# Altium integrated library ALTIUM-PHD_2_54_SMT_SOCKET_HEADER_6100XXXXX21-rev16c.IntLib: 215 symbols (continued)
## 610026243021
designator J?, comment 26p  (value not drawn)
WR-PHD 2.54 mm SMT Dual Socket Header Bottom Entry, 26p; PartNumber: 610026243021; PublishedDate: July 2016; Publisher: Wurth Elektronik; ComponentLink1Description: Manufacturer; ComponentLink1URL: http://www.we-online.de; ComponentLink2Description: Datasheet; ComponentLink2URL: http://katalog.we-online.de/em/datasheet/6100xx243021.pdf; PinNumber: 26p
footprint 610026243021
pins: 1, 2, 3, 4, 5, 6, 7, 8, 9, 10, 11, 12, 13, 14, 15, 16, 17, 18, 19, 20, 21, 22, 23, 24, 25, 26

## 610028243021
designator J?, comment 28p  (value not drawn)
WR-PHD 2.54 mm SMT Dual Socket Header Bottom Entry, 28p; PartNumber: 610028243021; PublishedDate: July 2016; Publisher: Wurth Elektronik; ComponentLink1Description: Manufacturer; ComponentLink1URL: http://www.we-online.de; ComponentLink2Description: Datasheet; ComponentLink2URL: http://katalog.we-online.de/em/datasheet/6100xx243021.pdf; PinNumber: 28p
footprint 610028243021
pins: 1, 2, 3, 4, 5, 6, 7, 8, 9, 10, 11, 12, 13, 14, 15, 16, 17, 18, 19, 20, 21, 22, 23, 24, 25, 26, 27, 28

## 610030243021
designator J?, comment 30p  (value not drawn)
WR-PHD 2.54 mm SMT Dual Socket Header Bottom Entry, 30p; PartNumber: 610030243021; PublishedDate: July 2016; Publisher: Wurth Elektronik; ComponentLink1Description: Manufacturer; ComponentLink1URL: http://www.we-online.de; ComponentLink2Description: Datasheet; ComponentLink2URL: http://katalog.we-online.de/em/datasheet/6100xx243021.pdf; PinNumber: 30p
footprint 610030243021
pins: 1, 2, 3, 4, 5, 6, 7, 8, 9, 10, 11, 12, 13, 14, 15, 16, 17, 18, 19, 20, 21, 22, 23, 24, 25, 26, 27, 28, 29, 30

## 610032243021
designator J?, comment 32p  (value not drawn)
WR-PHD 2.54 mm SMT Dual Socket Header Bottom Entry, 32p; PartNumber: 610032243021; PublishedDate: July 2016; Publisher: Wurth Elektronik; ComponentLink1Description: Manufacturer; ComponentLink1URL: http://www.we-online.de; ComponentLink2Description: Datasheet; ComponentLink2URL: http://katalog.we-online.de/em/datasheet/6100xx243021.pdf; PinNumber: 32p
footprint 610032243021
pins: 1, 2, 3, 4, 5, 6, 7, 8, 9, 10, 11, 12, 13, 14, 15, 16, 17, 18, 19, 20, 21, 22, 23, 24, 25, 26, 27, 28, 29, 30, 31, 32

## 610034243021
designator J?, comment 34p  (value not drawn)
WR-PHD 2.54 mm SMT Dual Socket Header Bottom Entry, 34p; PartNumber: 610034243021; PublishedDate: July 2016; Publisher: Wurth Elektronik; ComponentLink1Description: Manufacturer; ComponentLink1URL: http://www.we-online.de; ComponentLink2Description: Datasheet; ComponentLink2URL: http://katalog.we-online.de/em/datasheet/6100xx243021.pdf; PinNumber: 34p
footprint 610034243021
pins: 1, 2, 3, 4, 5, 6, 7, 8, 9, 10, 11, 12, 13, 14, 15, 16, 17, 18, 19, 20, 21, 22, 23, 24, 25, 26, 27, 28, 29, 30, 31, 32, 33, 34

## 610036243021
designator J?, comment 36p  (value not drawn)
WR-PHD 2.54 mm SMT Dual Socket Header Bottom Entry, 36p; PartNumber: 610036243021; PublishedDate: July 2016; Publisher: Wurth Elektronik; ComponentLink1Description: Manufacturer; ComponentLink1URL: http://www.we-online.de; ComponentLink2Description: Datasheet; ComponentLink2URL: http://katalog.we-online.de/em/datasheet/6100xx243021.pdf; PinNumber: 36p
footprint 610036243021
pins: 1, 2, 3, 4, 5, 6, 7, 8, 9, 10, 11, 12, 13, 14, 15, 16, 17, 18, 19, 20, 21, 22, 23, 24, 25, 26, 27, 28, 29, 30, 31, 32, 33, 34, 35, 36


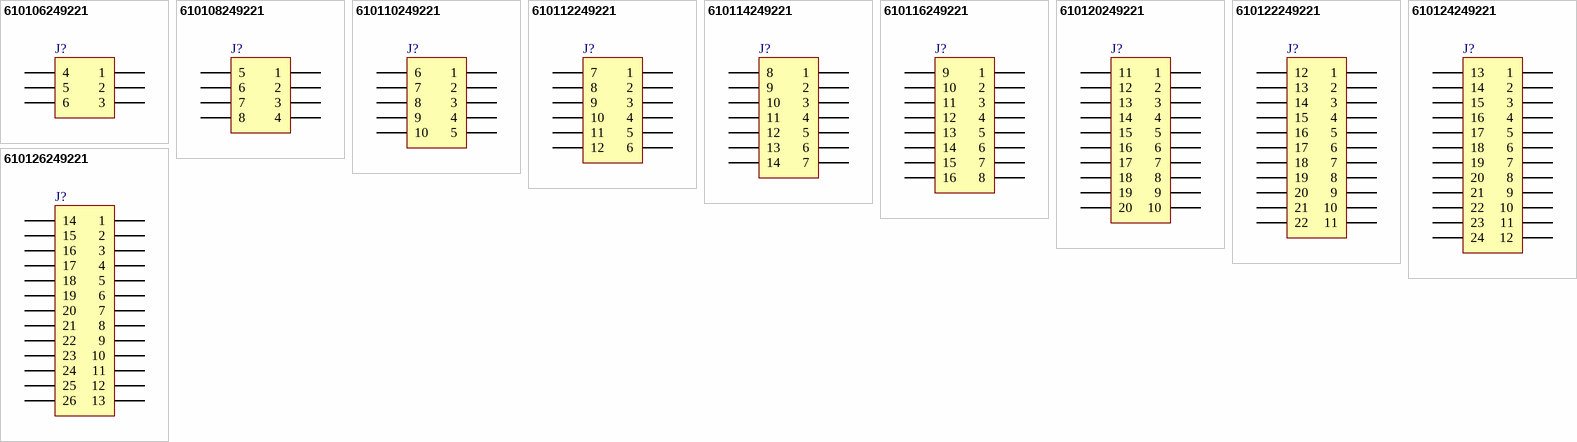
[diagram p4: symbols 610106249221 to 610126249221]

## 610106249221
designator J?, comment 06p  (value not drawn)
WR-PHD 2.54 mm PCB Socket Header-SMT Type-Double Row-Right Angle, 06p; PartNumber: 610106249221; PublishedDate: July 2016; Publisher: Wurth Elektronik; ComponentLink1Description: Manufacturer; ComponentLink1URL: http://www.we-online.de; ComponentLink2Description: Datasheet; ComponentLink2URL: http://katalog.we-online.de/em/datasheet/6101xx249221.pdf; PinNumber: 06p
footprint 610106249221
pins: 1, 2, 3, 4, 5, 6

## 610108249221
designator J?, comment 08p  (value not drawn)
WR-PHD 2.54 mm PCB Socket Header-SMT Type-Double Row-Right Angle, 08p; PartNumber: 610108249221; PublishedDate: July 2016; Publisher: Wurth Elektronik; ComponentLink1Description: Manufacturer; ComponentLink1URL: http://www.we-online.de; ComponentLink2Description: Datasheet; ComponentLink2URL: http://katalog.we-online.de/em/datasheet/6101xx249221.pdf; PinNumber: 08p
footprint 610108249221
pins: 1, 2, 3, 4, 5, 6, 7, 8

## 610110249221
designator J?, comment 10p  (value not drawn)
WR-PHD 2.54 mm PCB Socket Header-SMT Type-Double Row-Right Angle, 10p; PartNumber: 610110249221; PublishedDate: July 2016; Publisher: Wurth Elektronik; ComponentLink1Description: Manufacturer; ComponentLink1URL: http://www.we-online.de; ComponentLink2Description: Datasheet; ComponentLink2URL: http://katalog.we-online.de/em/datasheet/6101xx249221.pdf; PinNumber: 10p
footprint 610110249221
pins: 1, 2, 3, 4, 5, 6, 7, 8, 9, 10

## 610112249221
designator J?, comment 12p  (value not drawn)
WR-PHD 2.54 mm PCB Socket Header-SMT Type-Double Row-Right Angle, 12p; PartNumber: 610112249221; PublishedDate: July 2016; Publisher: Wurth Elektronik; ComponentLink1Description: Manufacturer; ComponentLink1URL: http://www.we-online.de; ComponentLink2Description: Datasheet; ComponentLink2URL: http://katalog.we-online.de/em/datasheet/6101xx249221.pdf; PinNumber: 12p
footprint 610112249221
pins: 1, 2, 3, 4, 5, 6, 7, 8, 9, 10, 11, 12

## 610114249221
designator J?, comment 14p  (value not drawn)
WR-PHD 2.54 mm PCB Socket Header-SMT Type-Double Row-Right Angle, 14p; PartNumber: 610114249221; PublishedDate: July 2016; Publisher: Wurth Elektronik; ComponentLink1Description: Manufacturer; ComponentLink1URL: http://www.we-online.de; ComponentLink2Description: Datasheet; ComponentLink2URL: http://katalog.we-online.de/em/datasheet/6101xx249221.pdf; PinNumber: 14p
footprint 610114249221
pins: 1, 2, 3, 4, 5, 6, 7, 8, 9, 10, 11, 12, 13, 14

## 610116249221
designator J?, comment 16p  (value not drawn)
WR-PHD 2.54 mm PCB Socket Header-SMT Type-Double Row-Right Angle, 16p; PartNumber: 610116249221; PublishedDate: July 2016; Publisher: Wurth Elektronik; ComponentLink1Description: Manufacturer; ComponentLink1URL: http://www.we-online.de; ComponentLink2Description: Datasheet; ComponentLink2URL: http://katalog.we-online.de/em/datasheet/6101xx249221.pdf; PinNumber: 16p
footprint 610116249221
pins: 1, 2, 3, 4, 5, 6, 7, 8, 9, 10, 11, 12, 13, 14, 15, 16

## 610120249221
designator J?, comment 20p  (value not drawn)
WR-PHD 2.54 mm PCB Socket Header-SMT Type-Double Row-Right Angle, 20p; PartNumber: 610120249221; PublishedDate: July 2016; Publisher: Wurth Elektronik; ComponentLink1Description: Manufacturer; ComponentLink1URL: http://www.we-online.de; ComponentLink2Description: Datasheet; ComponentLink2URL: http://katalog.we-online.de/em/datasheet/6101xx249221.pdf; PinNumber: 20p
footprint 610120249221
pins: 1, 2, 3, 4, 5, 6, 7, 8, 9, 10, 11, 12, 13, 14, 15, 16, 17, 18, 19, 20

## 610122249221
designator J?, comment 22p  (value not drawn)
WR-PHD 2.54 mm PCB Socket Header-SMT Type-Double Row-Right Angle, 22p; PartNumber: 610122249221; PublishedDate: July 2016; Publisher: Wurth Elektronik; ComponentLink1Description: Manufacturer; ComponentLink1URL: http://www.we-online.de; ComponentLink2Description: Datasheet; ComponentLink2URL: http://katalog.we-online.de/em/datasheet/6101xx249221.pdf; PinNumber: 22p
footprint 610122249221
pins: 1, 2, 3, 4, 5, 6, 7, 8, 9, 10, 11, 12, 13, 14, 15, 16, 17, 18, 19, 20, 21, 22

## 610124249221
designator J?, comment 24p  (value not drawn)
WR-PHD 2.54 mm PCB Socket Header-SMT Type-Double Row-Right Angle, 24p; PartNumber: 610124249221; PublishedDate: July 2016; Publisher: Wurth Elektronik; ComponentLink1Description: Manufacturer; ComponentLink1URL: http://www.we-online.de; ComponentLink2Description: Datasheet; ComponentLink2URL: http://katalog.we-online.de/em/datasheet/6101xx249221.pdf; PinNumber: 24p
footprint 610124249221
pins: 1, 2, 3, 4, 5, 6, 7, 8, 9, 10, 11, 12, 13, 14, 15, 16, 17, 18, 19, 20, 21, 22, 23, 24

## 610126249221
designator J?, comment 26p  (value not drawn)
WR-PHD 2.54 mm PCB Socket Header-SMT Type-Double Row-Right Angle, 26p; PartNumber: 610126249221; PublishedDate: July 2016; Publisher: Wurth Elektronik; ComponentLink1Description: Manufacturer; ComponentLink1URL: http://www.we-online.de; ComponentLink2Description: Datasheet; ComponentLink2URL: http://katalog.we-online.de/em/datasheet/6101xx249221.pdf; PinNumber: 26p
footprint 610126249221
pins: 1, 2, 3, 4, 5, 6, 7, 8, 9, 10, 11, 12, 13, 14, 15, 16, 17, 18, 19, 20, 21, 22, 23, 24, 25, 26


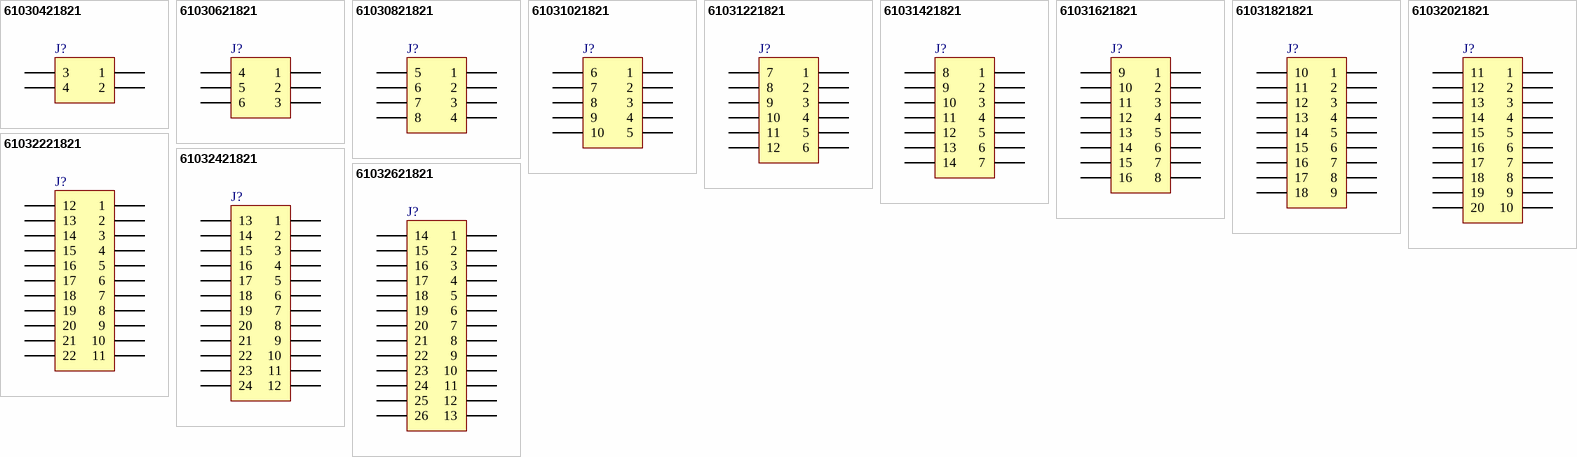
[diagram p5: symbols 61030421821 to 61032621821]

## 61030421821
designator J?, comment 04p  (value not drawn)
WR-PHD 2.54 mm Dual SMT Socket Header (Reel), 04p; PartNumber: 61030421821; PublishedDate: July 2016; Publisher: Wurth Elektronik; ComponentLink1Description: Manufacturer; ComponentLink1URL: http://www.we-online.de; ComponentLink2Description: Datasheet; ComponentLink2URL: http://katalog.we-online.de/em/datasheet/6103xx21821.pdf; PinNumber: 04p
footprint 61030421821
pins: 1, 2, 3, 4

## 61030621821
designator J?, comment 06p  (value not drawn)
WR-PHD 2.54 mm Dual SMT Socket Header (Reel), 06p; PartNumber: 61030621821; PublishedDate: July 2016; Publisher: Wurth Elektronik; ComponentLink1Description: Manufacturer; ComponentLink1URL: http://www.we-online.de; ComponentLink2Description: Datasheet; ComponentLink2URL: http://katalog.we-online.de/em/datasheet/6103xx21821.pdf; PinNumber: 06p
footprint 61030621821
pins: 1, 2, 3, 4, 5, 6

## 61030821821
designator J?, comment 08p  (value not drawn)
WR-PHD 2.54 mm Dual SMT Socket Header (Reel), 08p; PartNumber: 61030821821; PublishedDate: July 2016; Publisher: Wurth Elektronik; ComponentLink1Description: Manufacturer; ComponentLink1URL: http://www.we-online.de; ComponentLink2Description: Datasheet; ComponentLink2URL: http://katalog.we-online.de/em/datasheet/6103xx21821.pdf; PinNumber: 08p
footprint 61030821821
pins: 1, 2, 3, 4, 5, 6, 7, 8

## 61031021821
designator J?, comment 10p  (value not drawn)
WR-PHD 2.54 mm Dual SMT Socket Header (Reel), 10p; PartNumber: 61031021821; PublishedDate: July 2016; Publisher: Wurth Elektronik; ComponentLink1Description: Manufacturer; ComponentLink1URL: http://www.we-online.de; ComponentLink2Description: Datasheet; ComponentLink2URL: http://katalog.we-online.de/em/datasheet/6103xx21821.pdf; PinNumber: 10p
footprint 61031021821
pins: 1, 2, 3, 4, 5, 6, 7, 8, 9, 10

## 61031221821
designator J?, comment 12p  (value not drawn)
WR-PHD 2.54 mm Dual SMT Socket Header (Reel), 12p; PartNumber: 61031221821; PublishedDate: July 2016; Publisher: Wurth Elektronik; ComponentLink1Description: Manufacturer; ComponentLink1URL: http://www.we-online.de; ComponentLink2Description: Datasheet; ComponentLink2URL: http://katalog.we-online.de/em/datasheet/6103xx21821.pdf; PinNumber: 12p
footprint 61031221821
pins: 1, 2, 3, 4, 5, 6, 7, 8, 9, 10, 11, 12

## 61031421821
designator J?, comment 14p  (value not drawn)
WR-PHD 2.54 mm Dual SMT Socket Header (Reel), 14p; PartNumber: 61031421821; PublishedDate: July 2016; Publisher: Wurth Elektronik; ComponentLink1Description: Manufacturer; ComponentLink1URL: http://www.we-online.de; ComponentLink2Description: Datasheet; ComponentLink2URL: http://katalog.we-online.de/em/datasheet/6103xx21821.pdf; PinNumber: 14p
footprint 61031421821
pins: 1, 2, 3, 4, 5, 6, 7, 8, 9, 10, 11, 12, 13, 14

## 61031621821
designator J?, comment 16p  (value not drawn)
WR-PHD 2.54 mm Dual SMT Socket Header (Reel), 16p; PartNumber: 61031621821; PublishedDate: July 2016; Publisher: Wurth Elektronik; ComponentLink1Description: Manufacturer; ComponentLink1URL: http://www.we-online.de; ComponentLink2Description: Datasheet; ComponentLink2URL: http://katalog.we-online.de/em/datasheet/6103xx21821.pdf; PinNumber: 16p
footprint 61031621821
pins: 1, 2, 3, 4, 5, 6, 7, 8, 9, 10, 11, 12, 13, 14, 15, 16

## 61031821821
designator J?, comment 18p  (value not drawn)
WR-PHD 2.54 mm Dual SMT Socket Header (Reel), 18p; PartNumber: 61031821821; PublishedDate: July 2016; Publisher: Wurth Elektronik; ComponentLink1Description: Manufacturer; ComponentLink1URL: http://www.we-online.de; ComponentLink2Description: Datasheet; ComponentLink2URL: http://katalog.we-online.de/em/datasheet/6103xx21821.pdf; PinNumber: 18p
footprint 61031821821
pins: 1, 2, 3, 4, 5, 6, 7, 8, 9, 10, 11, 12, 13, 14, 15, 16, 17, 18

## 61032021821
designator J?, comment 20p  (value not drawn)
WR-PHD 2.54 mm Dual SMT Socket Header (Reel), 20p; PartNumber: 61032021821; PublishedDate: July 2016; Publisher: Wurth Elektronik; ComponentLink1Description: Manufacturer; ComponentLink1URL: http://www.we-online.de; ComponentLink2Description: Datasheet; ComponentLink2URL: http://katalog.we-online.de/em/datasheet/6103xx21821.pdf; PinNumber: 20p
footprint 61032021821
pins: 1, 2, 3, 4, 5, 6, 7, 8, 9, 10, 11, 12, 13, 14, 15, 16, 17, 18, 19, 20

## 61032221821
designator J?, comment 22p  (value not drawn)
WR-PHD 2.54 mm Dual SMT Socket Header (Reel), 22p; PartNumber: 61032221821; PublishedDate: July 2016; Publisher: Wurth Elektronik; ComponentLink1Description: Manufacturer; ComponentLink1URL: http://www.we-online.de; ComponentLink2Description: Datasheet; ComponentLink2URL: http://katalog.we-online.de/em/datasheet/6103xx21821.pdf; PinNumber: 22p
footprint 61032221821
pins: 1, 2, 3, 4, 5, 6, 7, 8, 9, 10, 11, 12, 13, 14, 15, 16, 17, 18, 19, 20, 21, 22

## 61032421821
designator J?, comment 24p  (value not drawn)
WR-PHD 2.54 mm Dual SMT Socket Header (Reel), 24p; PartNumber: 61032421821; PublishedDate: July 2016; Publisher: Wurth Elektronik; ComponentLink1Description: Manufacturer; ComponentLink1URL: http://www.we-online.de; ComponentLink2Description: Datasheet; ComponentLink2URL: http://katalog.we-online.de/em/datasheet/6103xx21821.pdf; PinNumber: 24p
footprint 61032421821
pins: 1, 2, 3, 4, 5, 6, 7, 8, 9, 10, 11, 12, 13, 14, 15, 16, 17, 18, 19, 20, 21, 22, 23, 24

## 61032621821
designator J?, comment 26p  (value not drawn)
WR-PHD 2.54 mm Dual SMT Socket Header (Reel), 26p; PartNumber: 61032621821; PublishedDate: July 2016; Publisher: Wurth Elektronik; ComponentLink1Description: Manufacturer; ComponentLink1URL: http://www.we-online.de; ComponentLink2Description: Datasheet; ComponentLink2URL: http://katalog.we-online.de/em/datasheet/6103xx21821.pdf; PinNumber: 26p
footprint 61032621821
pins: 1, 2, 3, 4, 5, 6, 7, 8, 9, 10, 11, 12, 13, 14, 15, 16, 17, 18, 19, 20, 21, 22, 23, 24, 25, 26


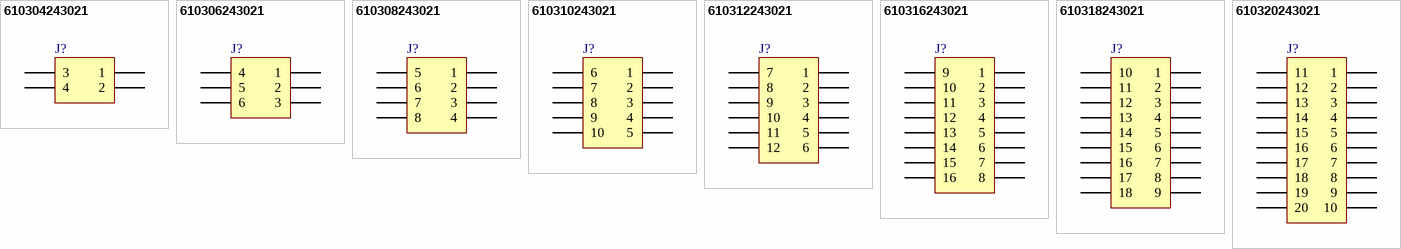
[diagram p6: symbols 610304243021 to 610320243021]

## 610304243021
designator J?, comment 04p  (value not drawn)
WR-PHD 2.54 mm SMT Dual Socket Header Bottom Entry, 04p; PartNumber: 610304243021; PublishedDate: July 2016; Publisher: Wurth Elektronik; ComponentLink1Description: Manufacturer; ComponentLink1URL: http://www.we-online.de; ComponentLink2Description: Datasheet; ComponentLink2URL: http://katalog.we-online.de/em/datasheet/6103xx243021.pdf; PinNumber: 04p
footprint 610304243021
pins: 1, 2, 3, 4

## 610306243021
designator J?, comment 06p  (value not drawn)
WR-PHD 2.54 mm SMT Dual Socket Header Bottom Entry, 06p; PartNumber: 610306243021; PublishedDate: July 2016; Publisher: Wurth Elektronik; ComponentLink1Description: Manufacturer; ComponentLink1URL: http://www.we-online.de; ComponentLink2Description: Datasheet; ComponentLink2URL: http://katalog.we-online.de/em/datasheet/6103xx243021.pdf; PinNumber: 06p
footprint 610306243021
pins: 1, 2, 3, 4, 5, 6

## 610308243021
designator J?, comment 08p  (value not drawn)
WR-PHD 2.54 mm SMT Dual Socket Header Bottom Entry, 08p; PartNumber: 610308243021; PublishedDate: July 2016; Publisher: Wurth Elektronik; ComponentLink1Description: Manufacturer; ComponentLink1URL: http://www.we-online.de; ComponentLink2Description: Datasheet; ComponentLink2URL: http://katalog.we-online.de/em/datasheet/6103xx243021.pdf; PinNumber: 08p
footprint 610308243021
pins: 1, 2, 3, 4, 5, 6, 7, 8

## 610310243021
designator J?, comment 10p  (value not drawn)
WR-PHD 2.54 mm SMT Dual Socket Header Bottom Entry, 10p; PartNumber: 610310243021; PublishedDate: July 2016; Publisher: Wurth Elektronik; ComponentLink1Description: Manufacturer; ComponentLink1URL: http://www.we-online.de; ComponentLink2Description: Datasheet; ComponentLink2URL: http://katalog.we-online.de/em/datasheet/6103xx243021.pdf; PinNumber: 10p
footprint 610310243021
pins: 1, 2, 3, 4, 5, 6, 7, 8, 9, 10

## 610312243021
designator J?, comment 12p  (value not drawn)
WR-PHD 2.54 mm SMT Dual Socket Header Bottom Entry, 12p; PartNumber: 610312243021; PublishedDate: July 2016; Publisher: Wurth Elektronik; ComponentLink1Description: Manufacturer; ComponentLink1URL: http://www.we-online.de; ComponentLink2Description: Datasheet; ComponentLink2URL: http://katalog.we-online.de/em/datasheet/6103xx243021.pdf; PinNumber: 12p
footprint 610312243021
pins: 1, 2, 3, 4, 5, 6, 7, 8, 9, 10, 11, 12

## 610316243021
designator J?, comment 16p  (value not drawn)
WR-PHD 2.54 mm SMT Dual Socket Header Bottom Entry, 16p; PartNumber: 610316243021; PublishedDate: July 2016; Publisher: Wurth Elektronik; ComponentLink1Description: Manufacturer; ComponentLink1URL: http://www.we-online.de; ComponentLink2Description: Datasheet; ComponentLink2URL: http://katalog.we-online.de/em/datasheet/6103xx243021.pdf; PinNumber: 16p
footprint 610316243021
pins: 1, 2, 3, 4, 5, 6, 7, 8, 9, 10, 11, 12, 13, 14, 15, 16

## 610318243021
designator J?, comment 18p  (value not drawn)
WR-PHD 2.54 mm SMT Dual Socket Header Bottom Entry, 18p; PartNumber: 610318243021; PublishedDate: July 2016; Publisher: Wurth Elektronik; ComponentLink1Description: Manufacturer; ComponentLink1URL: http://www.we-online.de; ComponentLink2Description: Datasheet; ComponentLink2URL: http://katalog.we-online.de/em/datasheet/6103xx243021.pdf; PinNumber: 18p
footprint 610318243021
pins: 1, 2, 3, 4, 5, 6, 7, 8, 9, 10, 11, 12, 13, 14, 15, 16, 17, 18

## 610320243021
designator J?, comment 20p  (value not drawn)
WR-PHD 2.54 mm SMT Dual Socket Header Bottom Entry, 20p; PartNumber: 610320243021; PublishedDate: July 2016; Publisher: Wurth Elektronik; ComponentLink1Description: Manufacturer; ComponentLink1URL: http://www.we-online.de; ComponentLink2Description: Datasheet; ComponentLink2URL: http://katalog.we-online.de/em/datasheet/6103xx243021.pdf; PinNumber: 20p
footprint 610320243021
pins: 1, 2, 3, 4, 5, 6, 7, 8, 9, 10, 11, 12, 13, 14, 15, 16, 17, 18, 19, 20


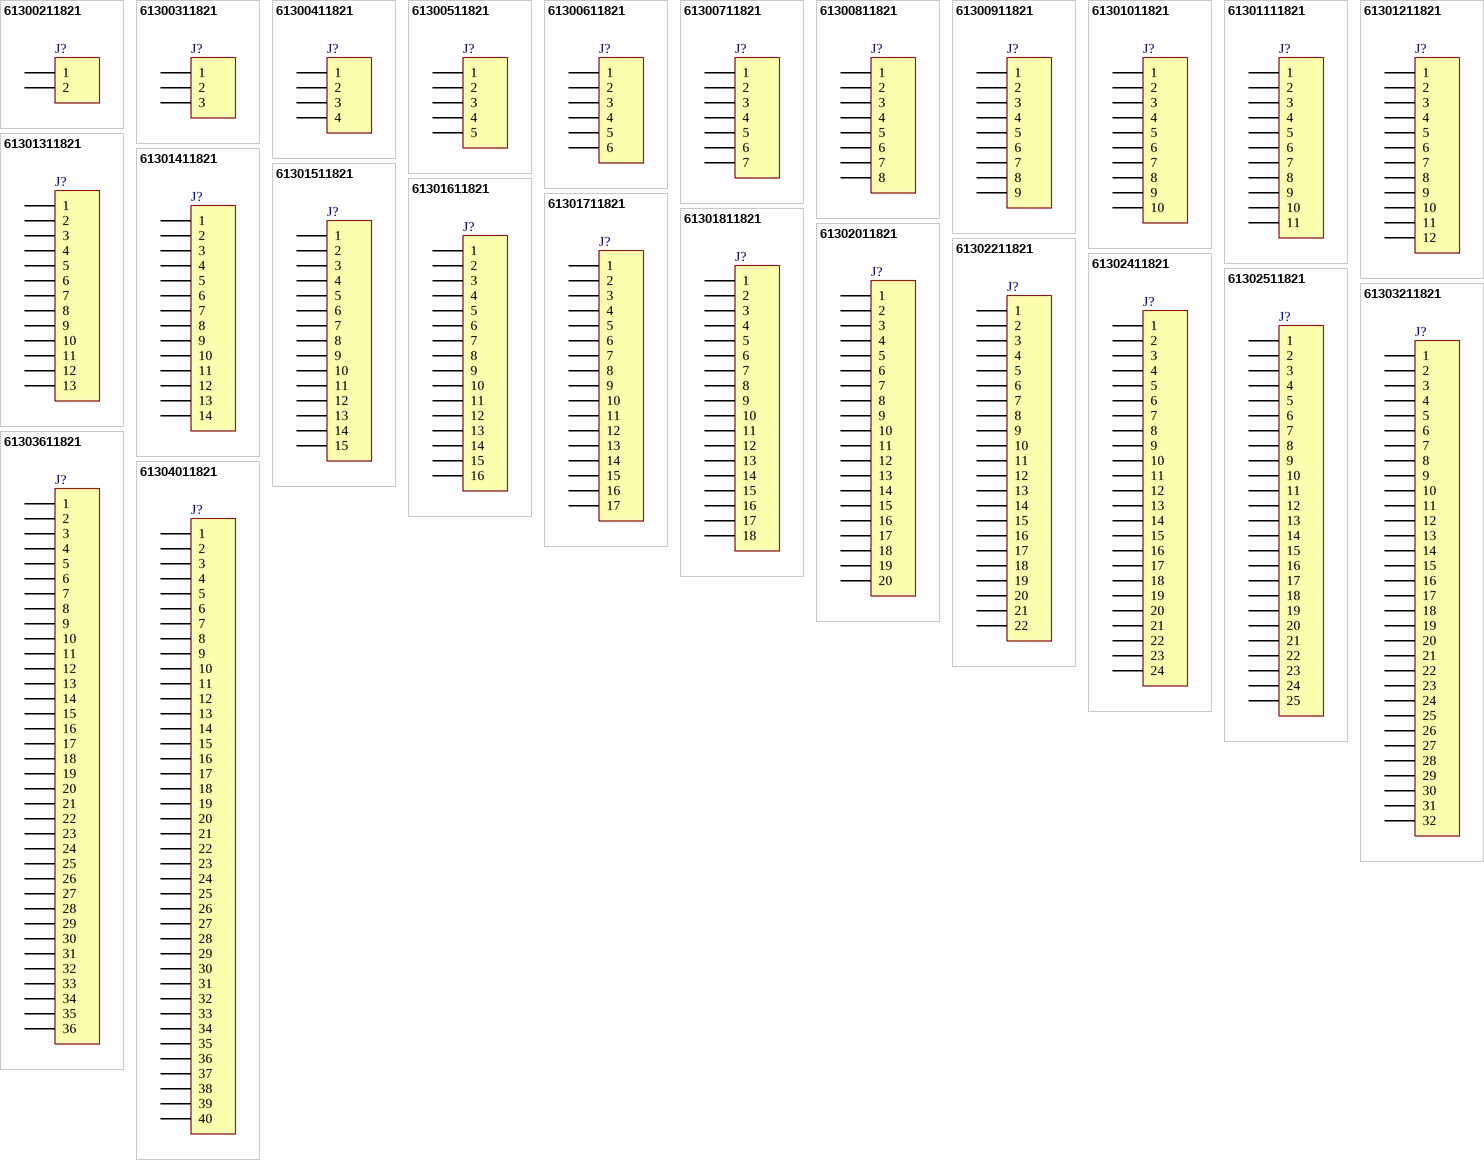
[diagram p7: symbols 61300211821 to 61304011821]

## 61300211821
designator J?, comment 02p  (value not drawn)
WR-PHD 2.54 mm Socket Header, 02p; PartNumber: 61300211821; PublishedDate: July 2016; Publisher: Wurth Elektronik; ComponentLink1Description: Manufacturer; ComponentLink1URL: http://www.we-online.de; ComponentLink2Description: Datasheet; ComponentLink2URL: http://katalog.we-online.de/em/datasheet/6130xx11821.pdf; PinNumber: 02p
footprint 61300211821
pins: 1, 2

## 61300311821
designator J?, comment 03p  (value not drawn)
WR-PHD 2.54 mm Socket Header, 03p; PartNumber: 61300311821; PublishedDate: July 2016; Publisher: Wurth Elektronik; ComponentLink1Description: Manufacturer; ComponentLink1URL: http://www.we-online.de; ComponentLink2Description: Datasheet; ComponentLink2URL: http://katalog.we-online.de/em/datasheet/6130xx11821.pdf; PinNumber: 03p
footprint 61300311821
pins: 1, 2, 3

## 61300411821
designator J?, comment 04p  (value not drawn)
WR-PHD 2.54 mm Socket Header, 04p; PartNumber: 61300411821; PublishedDate: July 2016; Publisher: Wurth Elektronik; ComponentLink1Description: Manufacturer; ComponentLink1URL: http://www.we-online.de; ComponentLink2Description: Datasheet; ComponentLink2URL: http://katalog.we-online.de/em/datasheet/6130xx11821.pdf; PinNumber: 04p
footprint 61300411821
pins: 1, 2, 3, 4

## 61300511821
designator J?, comment 05p  (value not drawn)
WR-PHD 2.54 mm Socket Header, 05p; PartNumber: 61300511821; PublishedDate: July 2016; Publisher: Wurth Elektronik; ComponentLink1Description: Manufacturer; ComponentLink1URL: http://www.we-online.de; ComponentLink2Description: Datasheet; ComponentLink2URL: http://katalog.we-online.de/em/datasheet/6130xx11821.pdf; PinNumber: 05p
footprint 61300511821
pins: 1, 2, 3, 4, 5

## 61300611821
designator J?, comment 06p  (value not drawn)
WR-PHD 2.54 mm Socket Header, 06p; PartNumber: 61300611821; PublishedDate: July 2016; Publisher: Wurth Elektronik; ComponentLink1Description: Manufacturer; ComponentLink1URL: http://www.we-online.de; ComponentLink2Description: Datasheet; ComponentLink2URL: http://katalog.we-online.de/em/datasheet/6130xx11821.pdf; PinNumber: 06p
footprint 61300611821
pins: 1, 2, 3, 4, 5, 6

## 61300711821
designator J?, comment 07p  (value not drawn)
WR-PHD 2.54 mm Socket Header, 07p; PartNumber: 61300711821; PublishedDate: July 2016; Publisher: Wurth Elektronik; ComponentLink1Description: Manufacturer; ComponentLink1URL: http://www.we-online.de; ComponentLink2Description: Datasheet; ComponentLink2URL: http://katalog.we-online.de/em/datasheet/6130xx11821.pdf; PinNumber: 07p
footprint 61300711821
pins: 1, 2, 3, 4, 5, 6, 7

## 61300811821
designator J?, comment 08p  (value not drawn)
WR-PHD 2.54 mm Socket Header, 08p; PartNumber: 61300811821; PublishedDate: July 2016; Publisher: Wurth Elektronik; ComponentLink1Description: Manufacturer; ComponentLink1URL: http://www.we-online.de; ComponentLink2Description: Datasheet; ComponentLink2URL: http://katalog.we-online.de/em/datasheet/6130xx11821.pdf; PinNumber: 08p
footprint 61300811821
pins: 1, 2, 3, 4, 5, 6, 7, 8

## 61300911821
designator J?, comment 09p  (value not drawn)
WR-PHD 2.54 mm Socket Header, 09p; PartNumber: 61300911821; PublishedDate: July 2016; Publisher: Wurth Elektronik; ComponentLink1Description: Manufacturer; ComponentLink1URL: http://www.we-online.de; ComponentLink2Description: Datasheet; ComponentLink2URL: http://katalog.we-online.de/em/datasheet/6130xx11821.pdf; PinNumber: 09p
footprint 61300911821
pins: 1, 2, 3, 4, 5, 6, 7, 8, 9

## 61301011821
designator J?, comment 10p  (value not drawn)
WR-PHD 2.54 mm Socket Header, 10p; PartNumber: 61301011821; PublishedDate: July 2016; Publisher: Wurth Elektronik; ComponentLink1Description: Manufacturer; ComponentLink1URL: http://www.we-online.de; ComponentLink2Description: Datasheet; ComponentLink2URL: http://katalog.we-online.de/em/datasheet/6130xx11821.pdf; PinNumber: 10p
footprint 61301011821
pins: 1, 2, 3, 4, 5, 6, 7, 8, 9, 10

## 61301111821
designator J?, comment 11p  (value not drawn)
WR-PHD 2.54 mm Socket Header, 11p; PartNumber: 61301111821; PublishedDate: July 2016; Publisher: Wurth Elektronik; ComponentLink1Description: Manufacturer; ComponentLink1URL: http://www.we-online.de; ComponentLink2Description: Datasheet; ComponentLink2URL: http://katalog.we-online.de/em/datasheet/6130xx11821.pdf; PinNumber: 11p
footprint 61301111821
pins: 1, 2, 3, 4, 5, 6, 7, 8, 9, 10, 11

## 61301211821
designator J?, comment 12p  (value not drawn)
WR-PHD 2.54 mm Socket Header, 12p; PartNumber: 61301211821; PublishedDate: July 2016; Publisher: Wurth Elektronik; ComponentLink1Description: Manufacturer; ComponentLink1URL: http://www.we-online.de; ComponentLink2Description: Datasheet; ComponentLink2URL: http://katalog.we-online.de/em/datasheet/6130xx11821.pdf; PinNumber: 12p
footprint 61301211821
pins: 1, 2, 3, 4, 5, 6, 7, 8, 9, 10, 11, 12

## 61301311821
designator J?, comment 13p  (value not drawn)
WR-PHD 2.54 mm Socket Header, 13p; PartNumber: 61301311821; PublishedDate: July 2016; Publisher: Wurth Elektronik; ComponentLink1Description: Manufacturer; ComponentLink1URL: http://www.we-online.de; ComponentLink2Description: Datasheet; ComponentLink2URL: http://katalog.we-online.de/em/datasheet/6130xx11821.pdf; PinNumber: 13p
footprint 61301311821
pins: 1, 2, 3, 4, 5, 6, 7, 8, 9, 10, 11, 12, 13

## 61301411821
designator J?, comment 14p  (value not drawn)
WR-PHD 2.54 mm Socket Header, 14p; PartNumber: 61301411821; PublishedDate: July 2016; Publisher: Wurth Elektronik; ComponentLink1Description: Manufacturer; ComponentLink1URL: http://www.we-online.de; ComponentLink2Description: Datasheet; ComponentLink2URL: http://katalog.we-online.de/em/datasheet/6130xx11821.pdf; PinNumber: 14p
footprint 61301411821
pins: 1, 2, 3, 4, 5, 6, 7, 8, 9, 10, 11, 12, 13, 14

## 61301511821
designator J?, comment 15p  (value not drawn)
WR-PHD 2.54 mm Socket Header, 15p; PartNumber: 61301511821; PublishedDate: July 2016; Publisher: Wurth Elektronik; ComponentLink1Description: Manufacturer; ComponentLink1URL: http://www.we-online.de; ComponentLink2Description: Datasheet; ComponentLink2URL: http://katalog.we-online.de/em/datasheet/6130xx11821.pdf; PinNumber: 15p
footprint 61301511821
pins: 1, 2, 3, 4, 5, 6, 7, 8, 9, 10, 11, 12, 13, 14, 15

## 61301611821
designator J?, comment 16p  (value not drawn)
WR-PHD 2.54 mm Socket Header, 16p; PartNumber: 61301611821; PublishedDate: July 2016; Publisher: Wurth Elektronik; ComponentLink1Description: Manufacturer; ComponentLink1URL: http://www.we-online.de; ComponentLink2Description: Datasheet; ComponentLink2URL: http://katalog.we-online.de/em/datasheet/6130xx11821.pdf; PinNumber: 16p
footprint 61301611821
pins: 1, 2, 3, 4, 5, 6, 7, 8, 9, 10, 11, 12, 13, 14, 15, 16

## 61301711821
designator J?, comment 17p  (value not drawn)
WR-PHD 2.54 mm Socket Header, 17p; PartNumber: 61301711821; PublishedDate: July 2016; Publisher: Wurth Elektronik; ComponentLink1Description: Manufacturer; ComponentLink1URL: http://www.we-online.de; ComponentLink2Description: Datasheet; ComponentLink2URL: http://katalog.we-online.de/em/datasheet/6130xx11821.pdf; PinNumber: 17p
footprint 61301711821
pins: 1, 2, 3, 4, 5, 6, 7, 8, 9, 10, 11, 12, 13, 14, 15, 16, 17

## 61301811821
designator J?, comment 18p  (value not drawn)
WR-PHD 2.54 mm Socket Header, 18p; PartNumber: 61301811821; PublishedDate: July 2016; Publisher: Wurth Elektronik; ComponentLink1Description: Manufacturer; ComponentLink1URL: http://www.we-online.de; ComponentLink2Description: Datasheet; ComponentLink2URL: http://katalog.we-online.de/em/datasheet/6130xx11821.pdf; PinNumber: 18p
footprint 61301811821
pins: 1, 2, 3, 4, 5, 6, 7, 8, 9, 10, 11, 12, 13, 14, 15, 16, 17, 18

## 61302011821
designator J?, comment 20p  (value not drawn)
WR-PHD 2.54 mm Socket Header, 20p; PartNumber: 61302011821; PublishedDate: July 2016; Publisher: Wurth Elektronik; ComponentLink1Description: Manufacturer; ComponentLink1URL: http://www.we-online.de; ComponentLink2Description: Datasheet; ComponentLink2URL: http://katalog.we-online.de/em/datasheet/6130xx11821.pdf; PinNumber: 20p
footprint 61302011821
pins: 1, 2, 3, 4, 5, 6, 7, 8, 9, 10, 11, 12, 13, 14, 15, 16, 17, 18, 19, 20

## 61302211821
designator J?, comment 22p  (value not drawn)
WR-PHD 2.54 mm Socket Header, 22p; PartNumber: 61302211821; PublishedDate: July 2016; Publisher: Wurth Elektronik; ComponentLink1Description: Manufacturer; ComponentLink1URL: http://www.we-online.de; ComponentLink2Description: Datasheet; ComponentLink2URL: http://katalog.we-online.de/em/datasheet/6130xx11821.pdf; PinNumber: 22p
footprint 61302211821
pins: 1, 2, 3, 4, 5, 6, 7, 8, 9, 10, 11, 12, 13, 14, 15, 16, 17, 18, 19, 20, 21, 22

## 61302411821
designator J?, comment 24p  (value not drawn)
WR-PHD 2.54 mm Socket Header, 24p; PartNumber: 61302411821; PublishedDate: July 2016; Publisher: Wurth Elektronik; ComponentLink1Description: Manufacturer; ComponentLink1URL: http://www.we-online.de; ComponentLink2Description: Datasheet; ComponentLink2URL: http://katalog.we-online.de/em/datasheet/6130xx11821.pdf; PinNumber: 24p
footprint 61302411821
pins: 1, 2, 3, 4, 5, 6, 7, 8, 9, 10, 11, 12, 13, 14, 15, 16, 17, 18, 19, 20, 21, 22, 23, 24

## 61302511821
designator J?, comment 25p  (value not drawn)
WR-PHD 2.54 mm Socket Header, 25p; PartNumber: 61302511821; PublishedDate: July 2016; Publisher: Wurth Elektronik; ComponentLink1Description: Manufacturer; ComponentLink1URL: http://www.we-online.de; ComponentLink2Description: Datasheet; ComponentLink2URL: http://katalog.we-online.de/em/datasheet/6130xx11821.pdf; PinNumber: 25p
footprint 61302511821
pins: 1, 2, 3, 4, 5, 6, 7, 8, 9, 10, 11, 12, 13, 14, 15, 16, 17, 18, 19, 20, 21, 22, 23, 24, 25
